# Altium footprint library Funk.PcbLib: 34 footprints (part 3 of 3)
Each footprint in its own frame and in the unit in brackets; x right, y up, seen from the top. Pads: shape width x height; smd on the part's side, far side on the other; paste and mask are expansions set on the pad; w line width, h text height; cw(c..) or ccw(c..) is an arc to the next point about the centre after c.
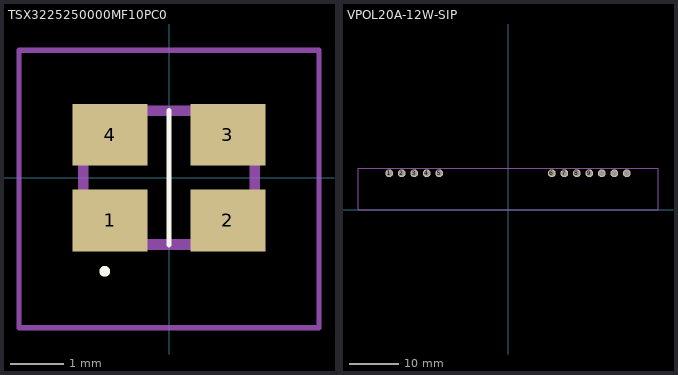
[diagram p2: the footprints below, top view; thin cyan lines are the x and y axes]

## TSX3225250000MF10PC0 [mm]
pads (4):
  rect 1.4x1.15 smd: 1(-1.1,-0.8) 2(1.1,-0.8) 3(1.1,0.8) 4(-1.1,0.8)
Top Overlay:
  lines w0.1: 0,1.2 0,-1.25 0,1.25 ; -1.2,-1.8 ccw(c-1.2,-1.75) -1.2,-1.7 ccw(c-1.2,-1.75) -1.2,-1.8
Mechanical 15:
  lines w0.2: -1.6,-1.25 1.6,-1.25 1.6,1.25 -1.6,1.25 -1.6,-1.25
Mechanical 20:
  lines w0.1: -2.8,-2.8 2.8,-2.8 2.8,2.375 -2.8,2.375 -2.8,-2.8
3D body "TSX-3225_25.0000MF10P-C0.stp": height 0.7, standoff 0, extent -1.685,-1.26 1.685,1.26

## VPOL20A-12W-SIP [mm]
pads (12):
  round 1.6 hole 1.15: 1(-24.15,7.4) 2(-21.61,7.4) 3(-19.07,7.4) 4(-16.53,7.4) 5(-13.99,7.4) 6(8.91,7.4) 7(11.45,7.4) 8(13.99,7.4) 9(16.53,7.4) 10(19.07,7.4) 11(21.61,7.4) 12(24.15,7.4)
Mechanical 1:
  lines w0.254: -30.5,8.382 30.5,8.382 ; -30.5,8.4 -30.5,0 30.5,0 30.5,8.4
3D body "CUI_VPOL20A-12W-SIP.step": height 12.95, standoff -3.6, extent -30.627,0.455 30.373,8.355